# Altium footprint library ref-packages.PCBLIB: 1543 footprints (part 55 of 103)
Each footprint in its own frame and in the unit in brackets; x right, y up, seen from the top. Pads: shape width x height; smd on the part's side, far side on the other; paste and mask are expansions set on the pad; w line width, h text height; cw(c..) or ccw(c..) is an arc to the next point about the centre after c.
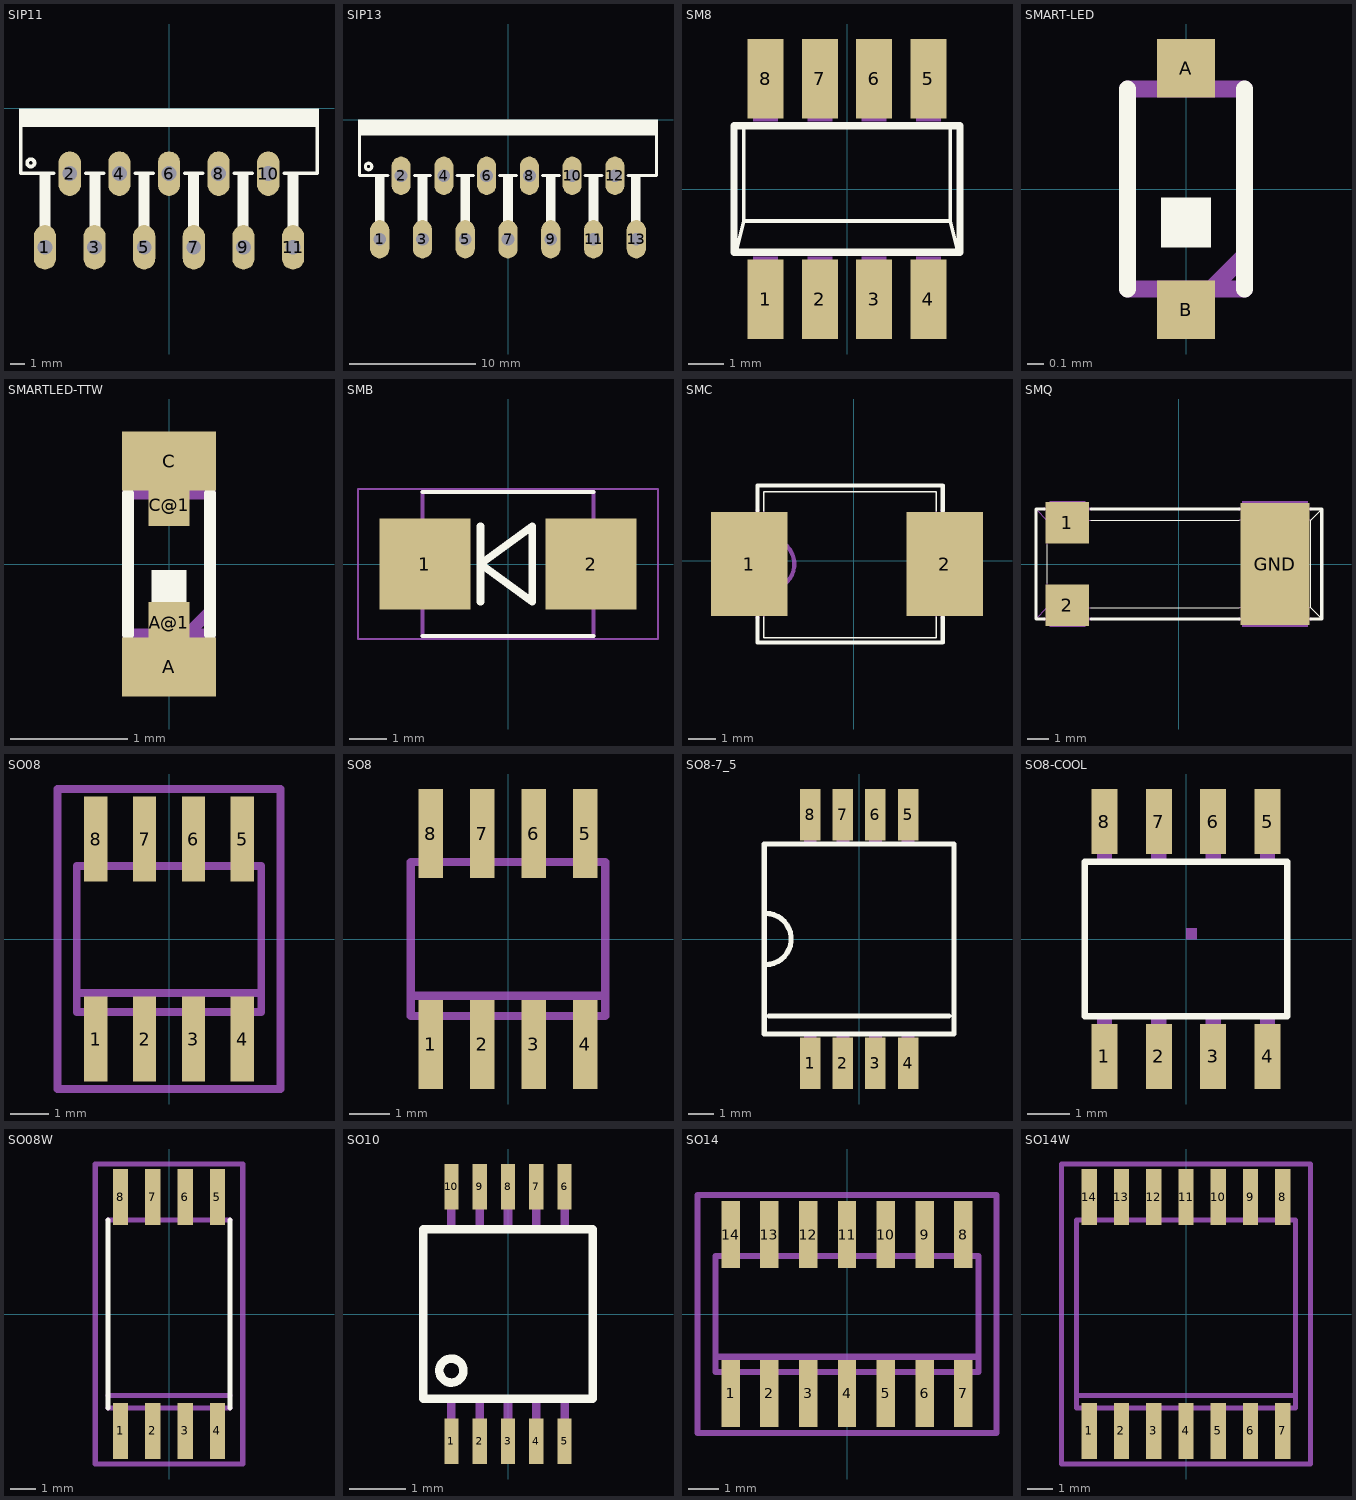
[diagram p54: the footprints below, top view; thin cyan lines are the x and y axes]

## SIP11 [mil]
pads (11):
  oval 60x120 hole 40: 1(-335,-375) 2(-268,-176) 3(-201,-375) 4(-134,-176) 5(-67,-375) 6(0,-176) 7(67,-375) 8(134,-176) 9(201,-375) 10(268,-176) 11(335,-375)
Top Overlay:
  circle w10: c-373,-147 r10
  rectangle: -405,-50 405,0
  rectangle: -350,-335 -320,-175
  rectangle: -215,-335 -185,-175
  rectangle: -82,-335 -52,-175
  rectangle: 51,-335 81,-175
  rectangle: 185,-335 215,-175
  rectangle: 320,-335 350,-175
  lines w10: -400,-50 -400,-175 -311,-175 ; -225,-175 -177,-175 ; -91,-175 -43,-175 ; 43,-175 91,-175 ; 177,-175 225,-175 ; 311,-175 400,-175 400,-50

## SIP13 [mil]
pads (13):
  oval 60x120 hole 40: 1(-402,-375) 2(-335,-176) 3(-268,-375) 4(-201,-176) 5(-134,-375) 6(-67,-176) 7(0,-375) 8(67,-176) 9(134,-375) 10(201,-176) 11(268,-375) 12(335,-176) 13(402,-375)
Top Overlay:
  circle w10: c-437,-147 r10
  rectangle: -470,-50 470,0
  rectangle: -417,-335 -387,-175
  rectangle: -283,-335 -253,-175
  rectangle: -149,-335 -119,-175
  rectangle: -15,-335 15,-175
  rectangle: 119,-335 149,-175
  rectangle: 253,-335 283,-175
  rectangle: 385,-335 415,-175
  lines w10: -465,-50 -465,-175 -377,-175 ; -293,-175 -243,-175 ; -160,-175 -108,-175 ; -26,-175 26,-175 ; 108,-175 161,-175 ; 242,-175 294,-175 ; 376,-175 465,-175 465,-50

## SM8 [mil]
pads (8):
  rect 40x88 smd: 1(-90,-122) 2(-30,-122) 3(30,-122) 4(90,-122) 5(90,122) 6(30,122) 7(-30,122) 8(-90,122)
Top Overlay:
  lines w4: -122.05,-66.93 -114.17,-35.43 ; -114.17,66.93 -114.17,-35.43 ; 114.17,66.93 114.17,-35.43 ; 122.05,-66.93 114.17,-35.43 ; -114.17,-35.43 114.17,-35.43
  lines w8: -125.08,-70 125.08,-70 125.08,70 -125.08,70 -125.08,-70
Mechanical 16:
  rectangle: -103.78,-143.7 -76.22,-74.8
  rectangle: -43.78,-143.7 -16.22,-74.8
  rectangle: 16.22,-143.7 43.78,-74.8
  rectangle: 76.22,-143.7 103.78,-74.8
  rectangle: 76.22,74.8 103.78,143.7
  rectangle: 16.22,74.8 43.78,143.7
  rectangle: -43.78,74.8 -16.22,143.7
  rectangle: -103.78,74.8 -76.22,143.7

## SMART-LED [mm]
pads (2):
  rect 0.35x0.35 smd: A(0,0.725) B(0,-0.725)
Top Overlay:
  rectangle: -0.15,-0.35 0.15,-0.05
  lines w0.102: -0.35,-0.6 -0.35,0.6 ; 0.35,-0.6 0.35,0.6
Mechanical 16:
  rectangle: -0.15,0.6 0.15,0.85
  rectangle: -0.15,-0.85 0.15,-0.6
  lines w0.102: -0.35,-0.6 0.15,-0.6 ; -0.35,0.6 0.35,0.6 ; 0.35,-0.6 0.15,-0.6 ; 0.35,-0.4 0.15,-0.6

## SMARTLED-TTW [mm]
pads (4):
  rect 0.8x0.5 smd: A(0,-0.875) C(0,0.875)
  rect 0.35x0.35 smd: A@1(0,-0.5) C@1(0,0.5)
Top Overlay:
  rectangle: -0.15,-0.35 0.15,-0.05
  lines w0.102: -0.35,-0.6 -0.35,0.6 ; 0.35,-0.6 0.35,0.6
Top Solder:
  rectangle: -0.175,0.325 0.175,0.7
  rectangle: -0.4,0.625 0.4,1.125
  rectangle: -0.4,-1.125 0.4,-0.625
  rectangle: -0.175,-0.675 0.175,-0.325
Mechanical 16:
  rectangle: -0.15,0.6 0.15,0.85
  rectangle: -0.15,-0.85 0.15,-0.6
  lines w0.102: -0.35,-0.6 0.15,-0.6 ; -0.35,0.6 0.35,0.6 ; 0.35,-0.6 0.15,-0.6 ; 0.35,-0.4 0.15,-0.6

## SMB [mil]
pads (2):
  rect 94.49x94.49 smd: 1(-86.61,0) 2(86.61,0)
Top Overlay:
  lines w4: -89,-75 89,-75 ; -89,75 89,75
  lines w8: -28.74,-39.37 -28.74,39.37 ; -28.74,0 25.32,39.37 25.32,-39.37 -28.74,0
Mechanical 16:
  rectangle: -110,-43 -89,43
  rectangle: 89,-43 110,43
  lines w4: -89.02,-75 -89.02,75 ; 89.02,-75 89.02,75
Mechanical 27:
  lines w2: -156.42,-78.07 156.42,-78.07 156.42,78.07 -156.42,78.07 -156.42,-78.07

## SMC [mil]
pads (2):
  rect 110x150 smd: 1(-150,-5) 2(131,-5)
Top Overlay:
  lines w2: -129,-81 -129,-111 119,-111 119,-81 ; -129,71 -129,99 119,99 119,71
  lines w6: -138,-82 -138,-118 128,-118 128,-82 ; -138,72 -138,108 128,108 128,72
Mechanical 16:
  rectangle: 130,-65 153,55
  rectangle: -163,-65 -140,55
  lines w2: -129,-81 -129,-42 ; -129,31 -129,71 ; 119,-81 119,71
  lines w6: -138,-82 -138,-39 ; -138,29 -138,72 ; -136.48,-38.82 ccw(c-122,-5.02) -136,28.98 ; 128,-82 128,72

## SMQ [mil]
pads (3):
  rect 79x75 smd: 1(-203,75) 2(-203,-75)
  rect 126x222 smd: GND(175,0)
Top Overlay:
  lines w2: -240,-35 -240,35 ; -160,-80 110,-80 ; -160,80 110,80 ; 260,-100 240,-80 240,80 260,100
  lines w6: -245,-100 -260,-100 -260,100 -245,100 ; -160,-100 110,-100 ; -160,100 110,100 ; 240,-100 260,-100 260,100 240,100
Mechanical 16:
  rectangle: 115,100 235,115
  rectangle: 115,-115 235,-100
  rectangle: -235,-115 -170,-100
  rectangle: -235,100 -170,115
  lines w2: -260,-100 -240,-80 ; -260,100 -240,80 ; -240,-35 -240,-80 ; -240,35 -240,80 ; -160,-80 -240,-80 ; -160,80 -240,80 ; 110,-80 240,-80 ; 110,80 240,80
  lines w6: -245,-100 -160,-100 ; -245,100 -160,100 ; 110,-100 240,-100 ; 110,100 240,100

## SO08 [mil]
pads (8):
  rect 23.62x86.61 smd: 1(-75,-102.36) 2(-25,-102.36) 3(25,-102.36) 4(75,-102.36) 5(75,102.36) 6(25,102.36) 7(-25,102.36) 8(-75,102.36)
Mechanical 16:
  rectangle: -84.65,-122.05 -65.35,-78.74
  rectangle: -34.65,-122.05 -15.35,-78.74
  rectangle: 15.35,-122.05 34.65,-78.74
  rectangle: 65.35,-122.05 84.65,-78.74
  rectangle: 65.35,78.74 84.65,122.05
  rectangle: 15.35,78.74 34.65,122.05
  rectangle: -34.65,78.74 -15.35,122.05
  rectangle: -84.65,78.74 -65.35,122.05
  lines w8: -94.49,-55.12 -94.49,-74.8 94.49,-74.8 94.49,-55.12 ; -94.49,-55.12 -94.49,74.8 94.49,74.8 94.49,-55.12 ; -94.49,-55.12 94.49,-55.12
Mechanical 27:
  lines w7.87: -114.17,-153.54 114.17,-153.54 114.17,153.54 -114.17,153.54 -114.17,-153.54

## SO8 [mil]
pads (8):
  rect 23.62x86.61 smd: 1(-75,-102.36) 2(-25,-102.36) 3(25,-102.36) 4(75,-102.36) 5(75,102.36) 6(25,102.36) 7(-25,102.36) 8(-75,102.36)
Mechanical 16:
  rectangle: -84.65,-122.05 -65.35,-78.74
  rectangle: -34.65,-122.05 -15.35,-78.74
  rectangle: 15.35,-122.05 34.65,-78.74
  rectangle: 65.35,-122.05 84.65,-78.74
  rectangle: 65.35,78.74 84.65,122.05
  rectangle: 15.35,78.74 34.65,122.05
  rectangle: -34.65,78.74 -15.35,122.05
  rectangle: -84.65,78.74 -65.35,122.05
  lines w8: -94.49,-55.12 -94.49,-74.8 94.49,-74.8 94.49,-55.12 ; -94.49,-55.12 -94.49,74.8 94.49,74.8 94.49,-55.12 ; -94.49,-55.12 94.49,-55.12

## SO8-7_5 [mil]
pads (8):
  rect 31.5x78.74 smd: 1(-75,-190.75) 2(-25,-190.75) 3(25,-190.75) 4(75,-190.75) 5(75,190.75) 6(25,190.75) 7(-25,190.75) 8(-75,190.75)
Top Overlay:
  lines w8: -143.64,-39.37 ccw(c-143.64,0) -143.64,39.37 ; -137.8,-118.11 137.8,-118.11 ; -145.67,-145.67 145.67,-145.67 145.67,145.67 -145.67,145.67 -145.67,-145.67
Mechanical 16:
  rectangle: -84.84,-208.66 -65.16,-147.64
  rectangle: -34.84,-208.66 -15.16,-147.64
  rectangle: 15.16,-208.66 34.84,-147.64
  rectangle: 65.16,-208.66 84.84,-147.64
  rectangle: 65.16,147.64 84.84,208.66
  rectangle: 15.16,147.64 34.84,208.66
  rectangle: -34.84,147.64 -15.16,208.66
  rectangle: -84.84,147.64 -65.16,208.66

## SO8-COOL [mil]
pads (8):
  rect 24x60 smd: 1(-75,-108) 2(-25,-108) 3(25,-108) 4(75,-108) 5(75,108) 6(25,108) 7(-25,108) 8(-75,108)
Top Overlay:
  lines w6: -92.99,-70.98 92.99,-70.98 92.99,70.98 -92.99,70.98 -92.99,-70.98
Mechanical 16:
  rectangle: -82,-113 -68,-73
  rectangle: -32,-113 -18,-73
  rectangle: 18,-113 32,-73
  rectangle: 68,-113 82,-73
  rectangle: -82,73 -68,113
  rectangle: -32,73 -18,113
  rectangle: 18,73 32,113
  rectangle: 68,73 82,113
  region: 0,0 10,0 10,10 0,10

## SO08W [mil]
pads (8):
  rect 23.62x86.61 smd: 1(-75,-181.1) 2(-25,-181.1) 3(25,-181.1) 4(75,-181.1) 5(75,181.1) 6(25,181.1) 7(-25,181.1) 8(-75,181.1)
Top Overlay:
  lines w8: -94.49,-145.67 -94.49,145.67 ; 94.49,-145.67 94.49,145.67
Mechanical 16:
  rectangle: -84.65,-209.45 -65.35,-149.61
  rectangle: -34.65,-209.45 -15.35,-149.61
  rectangle: 15.35,-209.45 34.65,-149.61
  rectangle: 65.35,-209.45 84.65,-149.61
  rectangle: 65.35,149.61 84.65,209.45
  rectangle: 15.35,149.61 34.65,209.45
  rectangle: -34.65,149.61 -15.35,209.45
  rectangle: -84.65,149.61 -65.35,209.45
  lines w8: -94.49,-145.67 94.49,-145.67 ; -94.49,-125.98 94.49,-125.98 ; -94.49,145.67 94.49,145.67
Mechanical 27:
  lines w7.87: -114.17,-232.28 114.17,-232.28 114.17,232.28 -114.17,232.28 -114.17,-232.28

## SO10 [mil]
pads (10):
  rect 9.84x31.5 smd: 1(-39.37,-88.58) 2(-19.69,-88.58) 3(0,-88.58) 4(19.69,-88.58) 5(39.37,-88.58) 6(39.37,88.58) 7(19.69,88.58) 8(0,88.58) 9(-19.69,88.58) 10(-39.37,88.58)
Top Overlay:
  circle w6: c-39.37,-39.37 r8.35
  lines w6: -59.06,-59.06 59.06,-59.06 59.06,59.06 -59.06,59.06 -59.06,-59.06
Mechanical 16:
  rectangle: -42.37,-99 -36.37,-60
  rectangle: -22.69,-99 -16.69,-60
  rectangle: -3,-99 3,-60
  rectangle: 16.69,-99 22.69,-60
  rectangle: 36.37,-99 42.37,-60
  rectangle: 36.37,60 42.37,99
  rectangle: 16.69,60 22.69,99
  rectangle: -3,60 3,99
  rectangle: -22.69,60 -16.69,99
  rectangle: -42.37,60 -36.37,99

## SO14 [mil]
pads (14):
  rect 23.62x86.61 smd: 1(-150,-102.36) 2(-100,-102.36) 3(-50,-102.36) 4(0,-102.36) 5(50,-102.36) 6(100,-102.36) 7(150,-102.36) 8(150,102.36) 9(100,102.36) 10(50,102.36) 11(0,102.36) 12(-50,102.36) 13(-100,102.36) 14(-150,102.36)
Mechanical 16:
  rectangle: -159.65,-122.05 -140.35,-78.74
  rectangle: -109.65,-122.05 -90.35,-78.74
  rectangle: -59.65,-122.05 -40.35,-78.74
  rectangle: -9.65,-122.05 9.65,-78.74
  rectangle: -9.65,78.74 9.65,122.05
  rectangle: -59.65,78.74 -40.35,122.05
  rectangle: -109.65,78.74 -90.35,122.05
  rectangle: -159.65,78.74 -140.35,122.05
  rectangle: 40.35,-122.05 59.65,-78.74
  rectangle: 90.35,-122.05 109.65,-78.74
  rectangle: 140.35,-122.05 159.65,-78.74
  rectangle: 140.35,78.74 159.65,122.05
  rectangle: 90.35,78.74 109.65,122.05
  rectangle: 40.35,78.74 59.65,122.05
  lines w8: -169.49,-55.12 -169.49,-74.8 169.49,-74.8 169.49,-55.12 ; -169.49,-55.12 -169.49,74.8 169.49,74.8 169.49,-55.12 ; -169.49,-55.12 169.49,-55.12
Mechanical 27:
  lines w7.87: -192.72,-153.54 192.72,-153.54 192.72,153.54 -192.72,153.54 -192.72,-153.54

## SO14W [mil]
pads (14):
  rect 23.62x86.61 smd: 1(-150,-181.1) 2(-100,-181.1) 3(-50,-181.1) 4(0,-181.1) 5(50,-181.1) 6(100,-181.1) 7(150,-181.1) 8(150,181.1) 9(100,181.1) 10(50,181.1) 11(0,181.1) 12(-50,181.1) 13(-100,181.1) 14(-150,181.1)
Mechanical 16:
  rectangle: -159.65,-209.45 -140.35,-149.61
  rectangle: -109.65,-209.45 -90.35,-149.61
  rectangle: -59.65,-209.45 -40.35,-149.61
  rectangle: -9.65,-209.45 9.65,-149.61
  rectangle: 40.35,-209.45 59.65,-149.61
  rectangle: 90.35,-209.45 109.65,-149.61
  rectangle: 140.35,-209.45 159.65,-149.61
  rectangle: 140.35,149.61 159.65,209.45
  rectangle: 90.35,149.61 109.65,209.45
  rectangle: 40.35,149.61 59.65,209.45
  rectangle: -9.65,149.61 9.65,209.45
  rectangle: -59.65,149.61 -40.35,209.45
  rectangle: -109.65,149.61 -90.35,209.45
  rectangle: -159.65,149.61 -140.35,209.45
  lines w8: -169.49,-125.98 -169.49,-145.67 169.49,-145.67 169.49,-125.98 ; -169.49,-125.98 -169.49,145.67 169.49,145.67 169.49,-125.98 ; -169.49,-125.98 169.49,-125.98
Mechanical 27:
  lines w7.87: -192.72,-232.28 192.72,-232.28 192.72,232.28 -192.72,232.28 -192.72,-232.28